# Altium schematic symbol library altera.SCHLIB: 68 symbols (part 4 of 6) (continued)
## EPF10K200-BGA672 (continued)
part 178 pins: L17 VCC (power)
part 179 pins: M2 VCC (power)
part 180 pins: M25 VCC (power)
part 181 pins: N11 VCC (power)
part 182 pins: N12 VCC (power)
part 183 pins: N15 VCC (power)
part 184 pins: P12 VCC (power)
part 185 pins: P15 VCC (power)
part 186 pins: P16 VCC (power)
part 187 pins: R14 VCC (power)
part 188 pins: T2 VCC (power)
part 189 pins: T10 VCC (power)
part 190 pins: T12 VCC (power)
part 191 pins: T17 VCC (power)
part 192 pins: T25 VCC (power)
part 193 pins: U16 VCC (power)
part 194 pins: Y7 VCC (power)
part 195 pins: AA26 VCCIO (power)
part 196 pins: AD15 VCCIO (power)
part 197 pins: C8 VCCIO (power)
part 198 pins: C15 VCCIO (power)
part 199 pins: D7 VCCIO (power)
part 200 pins: G3 VCCIO (power)
part 201 pins: J3 VCCIO (power)
part 202 pins: J17 VCCIO (power)
part 203 pins: K11 VCCIO (power)
part 204 pins: K22 VCCIO (power)
part 205 pins: L13 VCCIO (power)
part 206 pins: L15 VCCIO (power)
part 207 pins: M11 VCCIO (power)
part 208 pins: M13 VCCIO (power)
part 209 pins: M16 VCCIO (power)
part 210 pins: M22 VCCIO (power)
part 211 pins: N16 VCCIO (power)
part 212 pins: P11 VCCIO (power)
part 213 pins: R5 VCCIO (power)
part 214 pins: R11 VCCIO (power)
part 215 pins: R13 VCCIO (power)
part 216 pins: R16 VCCIO (power)
part 217 pins: R22 VCCIO (power)
part 218 pins: T15 VCCIO (power)
part 219 pins: U3 VCCIO (power)
part 220 pins: U11 VCCIO (power)
part 221 pins: V5 VCCIO (power)
part 222 pins: V17 VCCIO (power)
part 223 pins: V24 VCCIO (power)
part 224 pins: Y2 VCCIO (power)
part 225 pins: Y24 VCCIO (power)

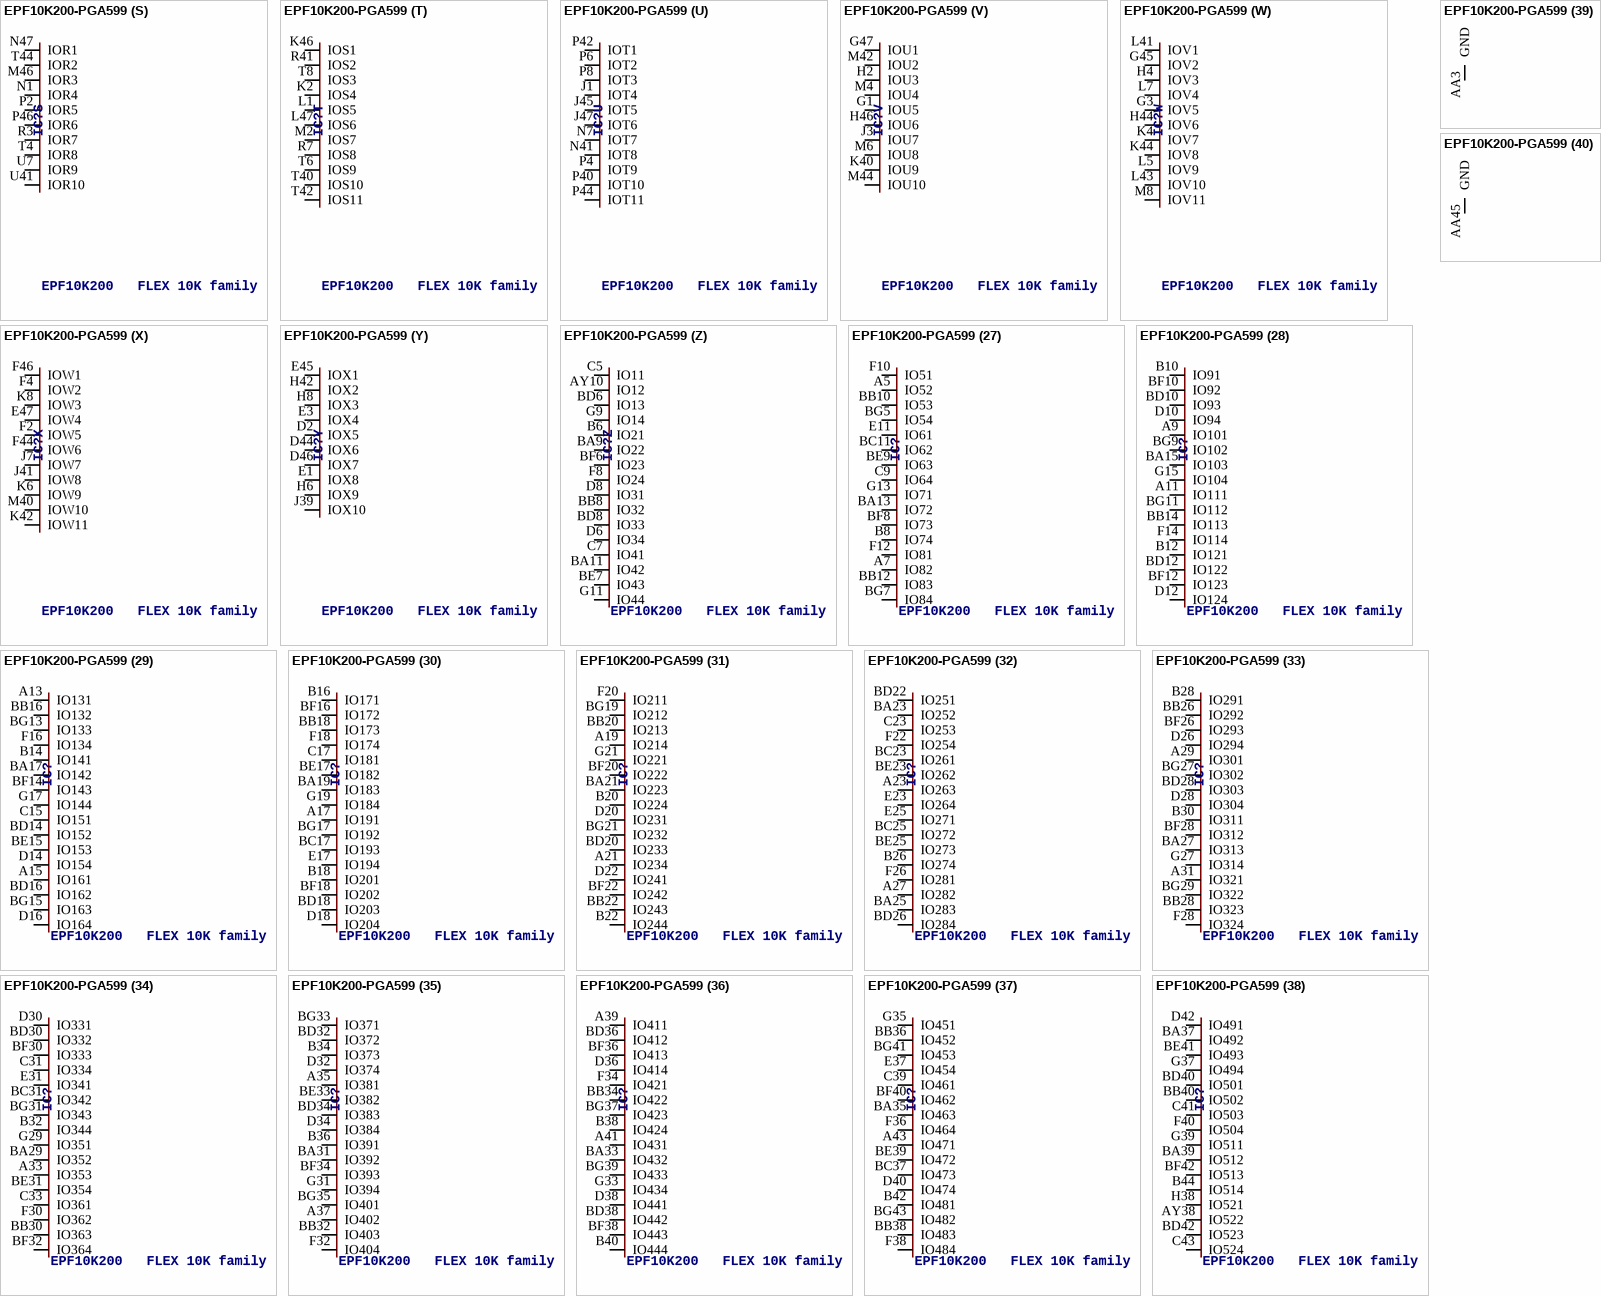
[diagram p33: symbol EPF10K200-PGA599]

## EPF10K200-PGA599
designator IC?, comment EPF10K200   FLEX 10K family
OC_FARNELL: unknown; OC_NEWARK: unknown
footprint PGA599
part A pins: A25 GCLK1, B4 /CONFIG, B24 IN1, B46 TRST, BB6 /CE, BB42 TDO, BC5 DATA0, BC43 CONF_DONE, BE5 DCLK, BE43 TCK, BF4 TDI, BF24 GCLK, BF44 /CEO, BG23 IN2, BG25 IN3, C3 MSEL1, C25 IN0, E43 /STATUS, F6 MSEL0, F42 TMS, W3 VCC_CKLK
part B pins: AW9 IOA4, AW39 IOA1, AY4 IOA5, AY6 IOA6, AY42 IOA3, AY44 IOA7, BC3 IOA8, BC45 IOA9, BD4 IOA10, BF2 IOA11, BF46 IOA2
part C pins: AV6 IOB5, AV8 IOB3, AV40 IOB6, AV42 IOB7, AW7 IOB8, AW41 IOB2, BB4 IOB4, BB44 IOB1, BB46 IOB9, BD2 IOB10, BD46 IOB11
part D pins: AT8 IOC3, AT40 IOC2, AU7 IOC5, AU41 IOC6, AV4 IOC4, AV44 IOC1, BA3 IOC7, BA45 IOC8, BB2 IOC9, BC47 IOC10
part E pins: AT4 IOD3, AT6 IOD5, AT42 IOD6, AT44 IOD2, AU5 IOD7, AU43 IOD8, AW3 IOD9, AW45 IOD1, AY2 IOD4, AY46 IOD10, BC1 IOD11
part F pins: AP4 IOE3, AP6 IOE4, AP8 IOE5, AP40 IOE6, AP42 IOE1, AP44 IOE7, AR7 IOE8, AR41 IOE9, AW47 IOE10, BA1 IOE2, BA47 IOE11
part G pins: AM8 IOF3, AM40 IOF4, AN7 IOF5, AN41 IOF1, AT46 IOF6, AU1 IOF7, AU47 IOF2, AV2 IOF8, AV46 IOF9, AW1 IOF10
part H pins: AL7 IOG3, AL41 IOG4, AM4 IOG2, AM6 IOG5, AM42 IOG6, AM44 IOG1, AP2 IOG7, AP46 IOG8, AR1 IOG9, AR47 IOG10, AT2 IOG11
part I pins: AK4 IOH4, AK6 IOH1, AK8 IOH2, AK40 IOH5, AK42 IOH6, AK44 IOH7, AL5 IOH3, AL43 IOH8, AN3 IOH9, AN45 IOH10, AN47 IOH11
part J pins: AH8 IOI3, AH40 IOI4, AJ7 IOI5, AJ41 IOI2, AL3 IOI6, AL45 IOI7, AL47 IOI8, AM2 IOI9, AM46 IOI10, AN1 IOI11
part K pins: AG7 IOJ5, AG41 IOJ6, AH4 IOJ3, AH6 IOJ7, AH42 IOJ1, AH44 IOJ8, AJ1 IOJ9, AJ47 IOJ10, AK2 IOJ4, AK46 IOJ11, AL1 IOJ12
part L pins: AF4 IOK3, AF6 IOK5, AF8 IOK6, AF40 IOK7, AF42 IOK2, AF44 IOK8, AF46 IOK9, AG1 IOK4, AG47 IOK1, AH2 IOK10, AH46 IOK11
part M pins: AD46 IOL4, AE1 IOL3, AE3 IOL5, AE5 IOL6, AE7 IOL7, AE41 IOL8, AE43 IOL2, AE45 IOL9, AE47 IOL1, AF2 IOL10
part N pins: AC1 IOM4, AC3 IOM3, AC5 IOM5, AC7 IOM6, AC41 IOM7, AC43 IOM2, AC45 IOM1, AC47 IOM8, AD2 IOM9, AD8 IOM10, AD40 IOM11
part O pins: AA1 ION5, AA47 ION6, AB2 ION4, AB4 ION7, AB6 ION8, AB8 ION3, AB40 ION2, AB42 ION9, AB44 ION1, AB46 ION10, Y46 ION11
part P pins: AA7 IOO4, AA41 IOO1, U47 IOO5, V2 IOO6, V46 IOO7, W1 IOO3, W47 IOO8, Y2 IOO9, Y4 IOO2, Y44 IOO10
part Q pins: T2 IOP4, T46 IOP5, U1 IOP6, U3 IOP2, U45 IOP1, W7 IOP7, W41 IOP8, Y6 IOP3, Y8 IOP9, Y40 IOP10, Y42 IOP11
part R pins: R1 IOQ2, R45 IOQ4, R47 IOQ5, U5 IOQ6, U43 IOQ7, V4 IOQ8, V6 IOQ3, V8 IOQ9, V40 IOQ10, V42 IOQ1, V44 IOQ11
part S pins: M46 IOR3, N1 IOR4, N47 IOR1, P2 IOR5, P46 IOR6, R3 IOR7, T4 IOR8, T44 IOR2, U7 IOR9, U41 IOR10
part T pins: K2 IOS4, K46 IOS1, L1 IOS5, L47 IOS6, M2 IOS7, R7 IOS8, R41 IOS2, T6 IOS9, T8 IOS3, T40 IOS10, T42 IOS11
part U pins: J1 IOT4, J45 IOT5, J47 IOT6, N7 IOT7, N41 IOT8, P4 IOT9, P6 IOT2, P8 IOT3, P40 IOT10, P42 IOT1, P44 IOT11
part V pins: G1 IOU5, G47 IOU1, H2 IOU3, H46 IOU6, J3 IOU7, K40 IOU9, M4 IOU4, M6 IOU8, M42 IOU2, M44 IOU10
part W pins: G3 IOV5, G45 IOV2, H4 IOV3, H44 IOV6, K4 IOV7, K44 IOV8, L5 IOV9, L7 IOV4, L41 IOV1, L43 IOV10, M8 IOV11
part X pins: E47 IOW4, F2 IOW5, F4 IOW2, F44 IOW6, F46 IOW1, J7 IOW7, J41 IOW8, K6 IOW9, K8 IOW3, K42 IOW11, M40 IOW10
part Y pins: D2 IOX5, D44 IOX6, D46 IOX7, E1 IOX8, E3 IOX4, E45 IOX1, H6 IOX9, H8 IOX3, H42 IOX2, J39 IOX10
part Z pins: AY10 IO12, B6 IO21, BA9 IO22, BA11 IO42, BB8 IO32, BD6 IO13, BD8 IO33, BE7 IO43, BF6 IO23, C5 IO11, C7 IO41, D6 IO34, D8 IO31, F8 IO24, G9 IO14, G11 IO44
part 27 pins: A5 IO52, A7 IO82, B8 IO74, BA13 IO72, BB10 IO53, BB12 IO83, BC11 IO62, BE9 IO63, BF8 IO73, BG5 IO54, BG7 IO84, C9 IO64, E11 IO61, F10 IO51, F12 IO81, G13 IO71
part 28 pins: A9 IO101, A11 IO111, B10 IO91, B12 IO121, BA15 IO103, BB14 IO113, BD10 IO93, BD12 IO122, BF10 IO92, BF12 IO123, BG9 IO102, BG11 IO112, D10 IO94, D12 IO124, F14 IO114, G15 IO104
part 29 pins: A13 IO131, A15 IO161, B14 IO141, BA17 IO142, BB16 IO132, BD14 IO152, BD16 IO162, BE15 IO153, BF14 IO143, BG13 IO133, BG15 IO163, C15 IO151, D14 IO154, D16 IO164, F16 IO134, G17 IO144
part 30 pins: A17 IO191, B16 IO171, B18 IO201, BA19 IO183, BB18 IO173, BC17 IO193, BD18 IO203, BE17 IO182, BF16 IO172, BF18 IO202, BG17 IO192, C17 IO181, D18 IO204, E17 IO194, F18 IO174, G19 IO184
part 31 pins: A19 IO214, A21 IO234, B20 IO224, B22 IO244, BA21 IO223, BB20 IO213, BB22 IO243, BD20 IO233, BF20 IO222, BF22 IO242, BG19 IO212, BG21 IO232, D20 IO231, D22 IO241, F20 IO211, G21 IO221
part 32 pins: A23 IO263, A27 IO282, B26 IO274, BA23 IO252, BA25 IO283, BC23 IO261, BC25 IO272, BD22 IO251, BD26 IO284, BE23 IO262, BE25 IO273, C23 IO253, E23 IO264, E25 IO271, F22 IO254, F26 IO281
part 33 pins: A29 IO301, A31 IO321, B28 IO291, B30 IO311, BA27 IO313, BB26 IO292, BB28 IO323, BD28 IO303, BF26 IO293, BF28 IO312, BG27 IO302, BG29 IO322, D26 IO294, D28 IO304, F28 IO324, G27 IO314
part 34 pins: A33 IO353, B32 IO344, BA29 IO352, BB30 IO363, BC31 IO342, BD30 IO332, BE31 IO354, BF30 IO333, BF32 IO364, BG31 IO343, C31 IO334, C33 IO361, D30 IO331, E31 IO341, F30 IO362, G29 IO351
part 35 pins: A35 IO381, A37 IO402, B34 IO373, B36 IO391, BA31 IO392, BB32 IO403, BD32 IO372, BD34 IO383, BE33 IO382, BF34 IO393, BG33 IO371, BG35 IO401, D32 IO374, D34 IO384, F32 IO404, G31 IO394
part 36 pins: A39 IO411, A41 IO431, B38 IO424, B40 IO444, BA33 IO432, BB34 IO422, BD36 IO412, BD38 IO442, BF36 IO413, BF38 IO443, BG37 IO423, BG39 IO433, D36 IO414, D38 IO441, F34 IO421, G33 IO434
part 37 pins: A43 IO471, B42 IO481, BA35 IO463, BB36 IO452, BB38 IO483, BC37 IO473, BE39 IO472, BF40 IO462, BG41 IO453, BG43 IO482, C39 IO461, D40 IO474, E37 IO454, F36 IO464, F38 IO484, G35 IO451
part 38 pins: AY38 IO522, B44 IO514, BA37 IO492, BA39 IO512, BB40 IO502, BD40 IO501, BD42 IO523, BE41 IO493, BF42 IO513, C41 IO503, C43 IO524, D42 IO491, F40 IO504, G37 IO494, G39 IO511, H38 IO521
part 39 pins: AA3 GND (power)
part 40 pins: AA45 GND (power)
part 41 pins: AD6 GND (power)
part 42 pins: AD42 GND (power)
part 43 pins: AG3 GND (power)
part 44 pins: AG45 GND (power)
part 45 pins: AJ5 GND (power)
part 46 pins: AJ43 GND (power)
part 47 pins: AR3 GND (power)
part 48 pins: AR5 GND (power)
part 49 pins: AR43 GND (power)
part 50 pins: AR45 GND (power)
part 51 pins: AY8 GND (power)
part 52 pins: AY40 GND (power)
part 53 pins: A47 GND (power)
part 54 pins: BA5 GND (power)
part 55 pins: BA43 GND (power)
part 56 pins: BB24 GND (power)
part 57 pins: BC7 GND (power)
part 58 pins: BC13 GND (power)
part 59 pins: BC19 GND (power)
part 60 pins: BC29 GND (power)
part 61 pins: BC35 GND (power)
part 62 pins: BC41 GND (power)
part 63 pins: BD44 GND (power)
part 64 pins: BE3 GND (power)
part 65 pins: BE13 GND (power)
part 66 pins: BE21 GND (power)
part 67 pins: BE27 GND (power)
part 68 pins: BE35 GND (power)
part 69 pins: BE45 GND (power)
part 70 pins: BG1 GND (power)
part 71 pins: BG47 GND (power)
part 72 pins: B2 GND (power)
part 73 pins: C13 GND (power)
part 74 pins: C21 GND (power)
part 75 pins: C27 GND (power)
part 76 pins: C35 GND (power)
part 77 pins: C45 GND (power)
part 78 pins: D4 GND (power)
part 79 pins: E7 GND (power)
part 80 pins: E13 GND (power)
part 81 pins: E19 GND (power)
part 82 pins: E29 GND (power)
part 83 pins: E35 GND (power)
part 84 pins: E41 GND (power)
part 85 pins: F24 GND (power)
part 86 pins: G5 GND (power)
part 87 pins: G23 GND (power)
part 88 pins: G43 GND (power)
part 89 pins: H40 GND (power)
part 90 pins: N3 GND (power)
part 91 pins: N5 GND (power)
part 92 pins: N43 GND (power)
part 93 pins: N45 GND (power)
part 94 pins: W5 GND (power)
part 95 pins: W43 GND (power)
part 96 pins: AJ3 VCC (power)
part 97 pins: AJ45 VCC (power)
part 98 pins: AU3 VCC (power)
part 99 pins: AU45 VCC (power)
part 100 pins: A3 VCC (power)
part 101 pins: A45 VCC (power)
part 102 pins: BE1 VCC (power)
part 103 pins: BE11 VCC (power)
part 104 pins: BE19 VCC (power)
part 105 pins: BE29 VCC (power)
part 106 pins: BE37 VCC (power)
part 107 pins: BE47 VCC (power)
part 108 pins: BG3 VCC (power)
part 109 pins: BG45 VCC (power)
part 110 pins: C1 VCC (power)
part 111 pins: C11 VCC (power)
part 112 pins: C19 VCC (power)
part 113 pins: C29 VCC (power)
part 114 pins: C37 VCC (power)
part 115 pins: C47 VCC (power)
part 116 pins: E5 VCC (power)
part 117 pins: G25 VCC (power)
part 118 pins: L3 VCC (power)
part 119 pins: L45 VCC (power)
part 120 pins: W45 VCC (power)
part 121 pins: AA5 VCCIO (power)
part 122 pins: AA43 VCCIO (power)
part 123 pins: AD4 VCCIO (power)
part 124 pins: AD44 VCCIO (power)
part 125 pins: AG5 VCCIO (power)
part 126 pins: AG43 VCCIO (power)
part 127 pins: AN5 VCCIO (power)
part 128 pins: AN43 VCCIO (power)
part 129 pins: AW5 VCCIO (power)
part 130 pins: AW43 VCCIO (power)
part 131 pins: BA7 VCCIO (power)
part 132 pins: BA41 VCCIO (power)
part 133 pins: BC9 VCCIO (power)
part 134 pins: BC15 VCCIO (power)
part 135 pins: BC21 VCCIO (power)
part 136 pins: BC27 VCCIO (power)
part 137 pins: BC33 VCCIO (power)
part 138 pins: BC39 VCCIO (power)
part 139 pins: BD24 VCCIO (power)
part 140 pins: D24 VCCIO (power)
part 141 pins: E9 VCCIO (power)
part 142 pins: E15 VCCIO (power)
part 143 pins: E21 VCCIO (power)
part 144 pins: E27 VCCIO (power)
part 145 pins: E33 VCCIO (power)
part 146 pins: E39 VCCIO (power)
part 147 pins: G7 VCCIO (power)
part 148 pins: G41 VCCIO (power)
part 149 pins: J5 VCCIO (power)
part 150 pins: J43 VCCIO (power)
part 151 pins: R5 VCCIO (power)
part 152 pins: R43 VCCIO (power)

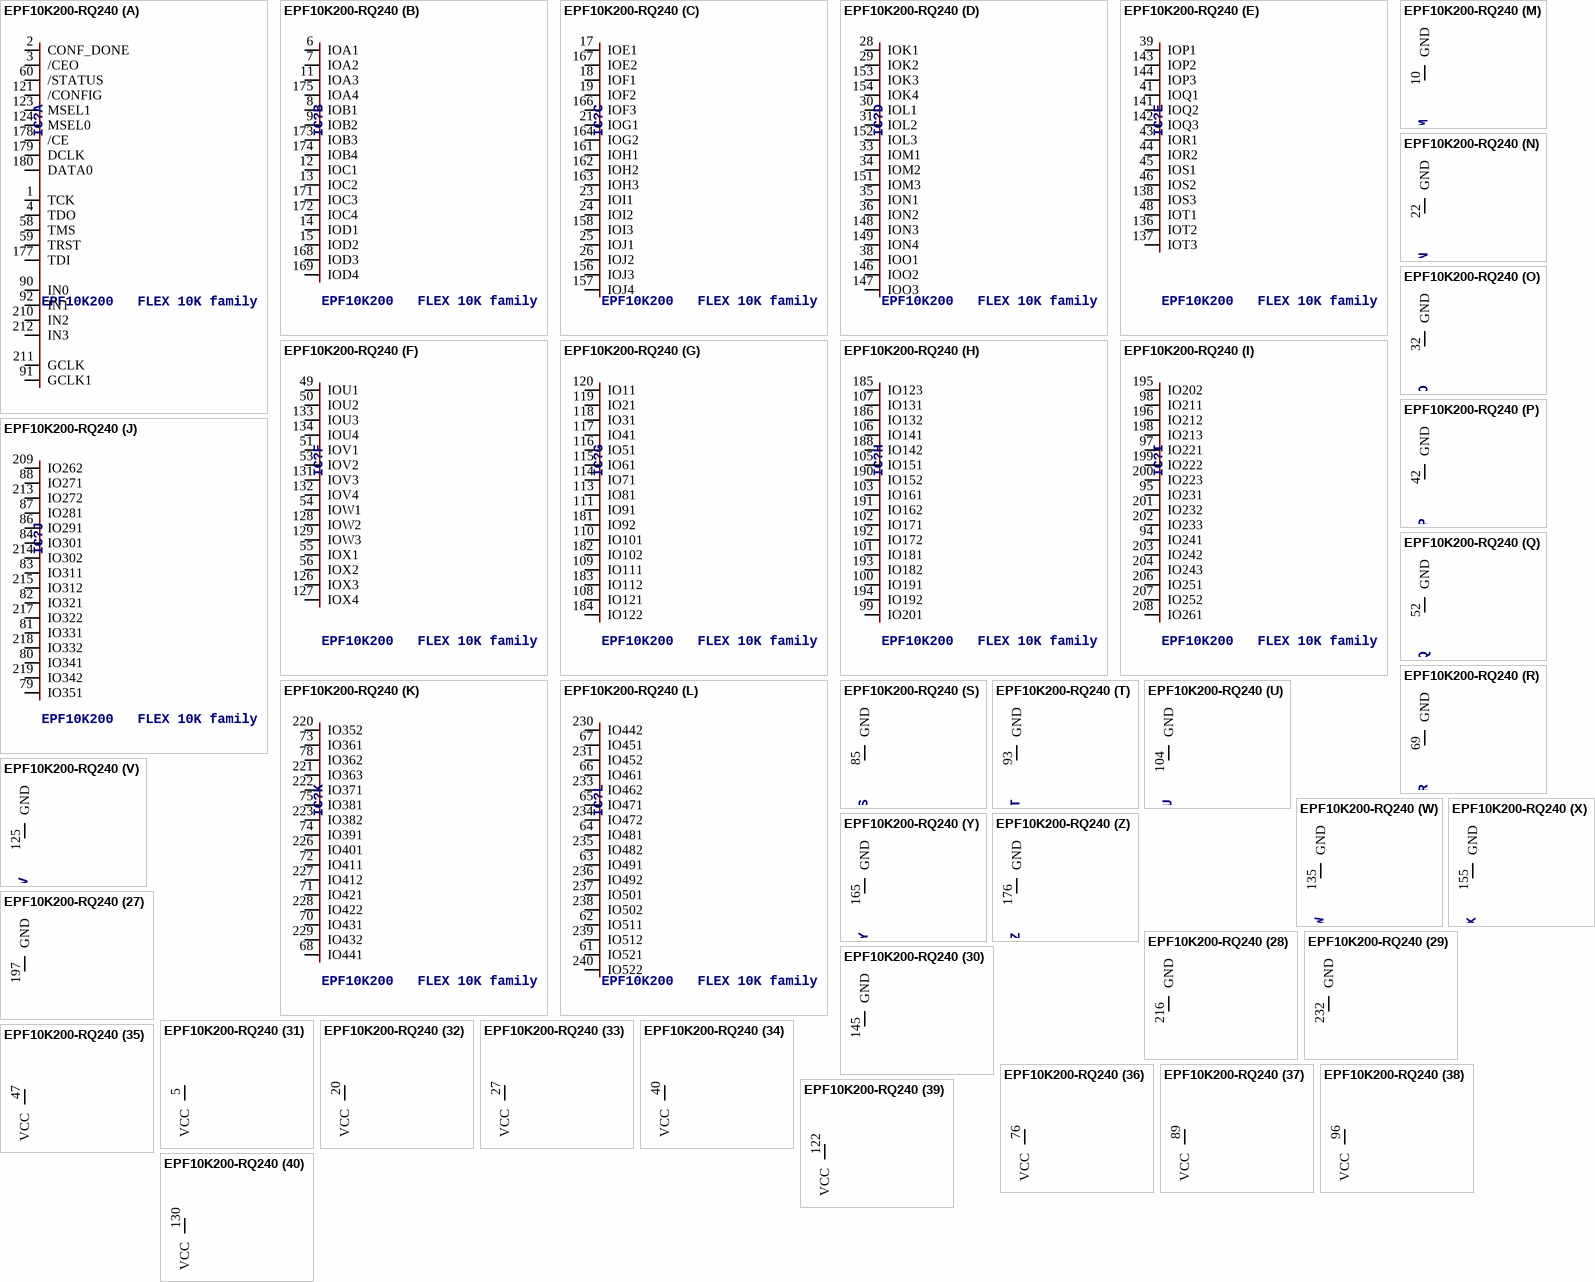
[diagram p34: symbol EPF10K200-RQ240]

## EPF10K200-RQ240
designator IC?, comment EPF10K200   FLEX 10K family
MPN: EPF10K200SRC240-3N; OC_FARNELL: unknown; OC_NEWARK: 51R8934
footprint RQFP240
part A pins: 1 TCK, 2 CONF_DONE, 3 /CEO, 4 TDO, 58 TMS, 59 TRST, 60 /STATUS, 90 IN0, 91 GCLK1, 92 IN1, 121 /CONFIG, 123 MSEL1, 124 MSEL0, 177 TDI, 178 /CE, 179 DCLK, 180 DATA0, 210 IN2, 211 GCLK, 212 IN3
part B pins: 6 IOA1, 7 IOA2, 8 IOB1, 9 IOB2, 11 IOA3, 12 IOC1, 13 IOC2, 14 IOD1, 15 IOD2, 168 IOD3, 169 IOD4, 171 IOC3, 172 IOC4, 173 IOB3, 174 IOB4, 175 IOA4
part C pins: 17 IOE1, 18 IOF1, 19 IOF2, 21 IOG1, 23 IOI1, 24 IOI2, 25 IOJ1, 26 IOJ2, 156 IOJ3, 157 IOJ4, 158 IOI3, 161 IOH1, 162 IOH2, 163 IOH3, 164 IOG2, 166 IOF3, 167 IOE2
part D pins: 28 IOK1, 29 IOK2, 30 IOL1, 31 IOL2, 33 IOM1, 34 IOM2, 35 ION1, 36 ION2, 38 IOO1, 146 IOO2, 147 IOO3, 148 ION3, 149 ION4, 151 IOM3, 152 IOL3, 153 IOK3, 154 IOK4
part E pins: 39 IOP1, 41 IOQ1, 43 IOR1, 44 IOR2, 45 IOS1, 46 IOS2, 48 IOT1, 136 IOT2, 137 IOT3, 138 IOS3, 141 IOQ2, 142 IOQ3, 143 IOP2, 144 IOP3
part F pins: 49 IOU1, 50 IOU2, 51 IOV1, 53 IOV2, 54 IOW1, 55 IOX1, 56 IOX2, 126 IOX3, 127 IOX4, 128 IOW2, 129 IOW3, 131 IOV3, 132 IOV4, 133 IOU3, 134 IOU4
part G pins: 108 IO121, 109 IO111, 110 IO101, 111 IO91, 113 IO81, 114 IO71, 115 IO61, 116 IO51, 117 IO41, 118 IO31, 119 IO21, 120 IO11, 181 IO92, 182 IO102, 183 IO112, 184 IO122
part H pins: 99 IO201, 100 IO191, 101 IO181, 102 IO171, 103 IO161, 105 IO151, 106 IO141, 107 IO131, 185 IO123, 186 IO132, 188 IO142, 190 IO152, 191 IO162, 192 IO172, 193 IO182, 194 IO192
part I pins: 94 IO241, 95 IO231, 97 IO221, 98 IO211, 195 IO202, 196 IO212, 198 IO213, 199 IO222, 200 IO223, 201 IO232, 202 IO233, 203 IO242, 204 IO243, 206 IO251, 207 IO252, 208 IO261
part J pins: 79 IO351, 80 IO341, 81 IO331, 82 IO321, 83 IO311, 84 IO301, 86 IO291, 87 IO281, 88 IO271, 209 IO262, 213 IO272, 214 IO302, 215 IO312, 217 IO322, 218 IO332, 219 IO342
part K pins: 68 IO441, 70 IO431, 71 IO421, 72 IO411, 73 IO361, 74 IO391, 75 IO381, 78 IO362, 220 IO352, 221 IO363, 222 IO371, 223 IO382, 226 IO401, 227 IO412, 228 IO422, 229 IO432
part L pins: 61 IO521, 62 IO511, 63 IO491, 64 IO481, 65 IO471, 66 IO461, 67 IO451, 230 IO442, 231 IO452, 233 IO462, 234 IO472, 235 IO482, 236 IO492, 237 IO501, 238 IO502, 239 IO512, 240 IO522
part M pins: 10 GND (power)
part N pins: 22 GND (power)
part O pins: 32 GND (power)
part P pins: 42 GND (power)
part Q pins: 52 GND (power)
part R pins: 69 GND (power)
part S pins: 85 GND (power)
part T pins: 93 GND (power)
part U pins: 104 GND (power)
part V pins: 125 GND (power)
part W pins: 135 GND (power)
part X pins: 155 GND (power)
part Y pins: 165 GND (power)
part Z pins: 176 GND (power)
part 27 pins: 197 GND (power)
part 28 pins: 216 GND (power)
part 29 pins: 232 GND (power)
part 30 pins: 145 GND (power)
part 31 pins: 5 VCC (power)
part 32 pins: 20 VCC (power)
part 33 pins: 27 VCC (power)
part 34 pins: 40 VCC (power)
part 35 pins: 47 VCC (power)
part 36 pins: 76 VCC (power)
part 37 pins: 89 VCC (power)
part 38 pins: 96 VCC (power)
part 39 pins: 122 VCC (power)
part 40 pins: 130 VCC (power)
part 41 pins: 139 VCC (power)
part 42 pins: 150 VCC (power)
part 43 pins: 159 VCC (power)
part 44 pins: 170 VCC (power)
part 45 pins: 187 VCC (power)
part 46 pins: 225 VCC (power)
part 47 pins: 16 VCCIO (power)
part 48 pins: 37 VCCIO (power)
part 49 pins: 57 VCCIO (power)
part 50 pins: 77 VCCIO (power)
part 51 pins: 112 VCCIO (power)
part 52 pins: 140 VCCIO (power)
part 53 pins: 160 VCCIO (power)
part 54 pins: 189 VCCIO (power)
part 55 pins: 205 VCCIO (power)
part 56 pins: 224 VCCIO (power)

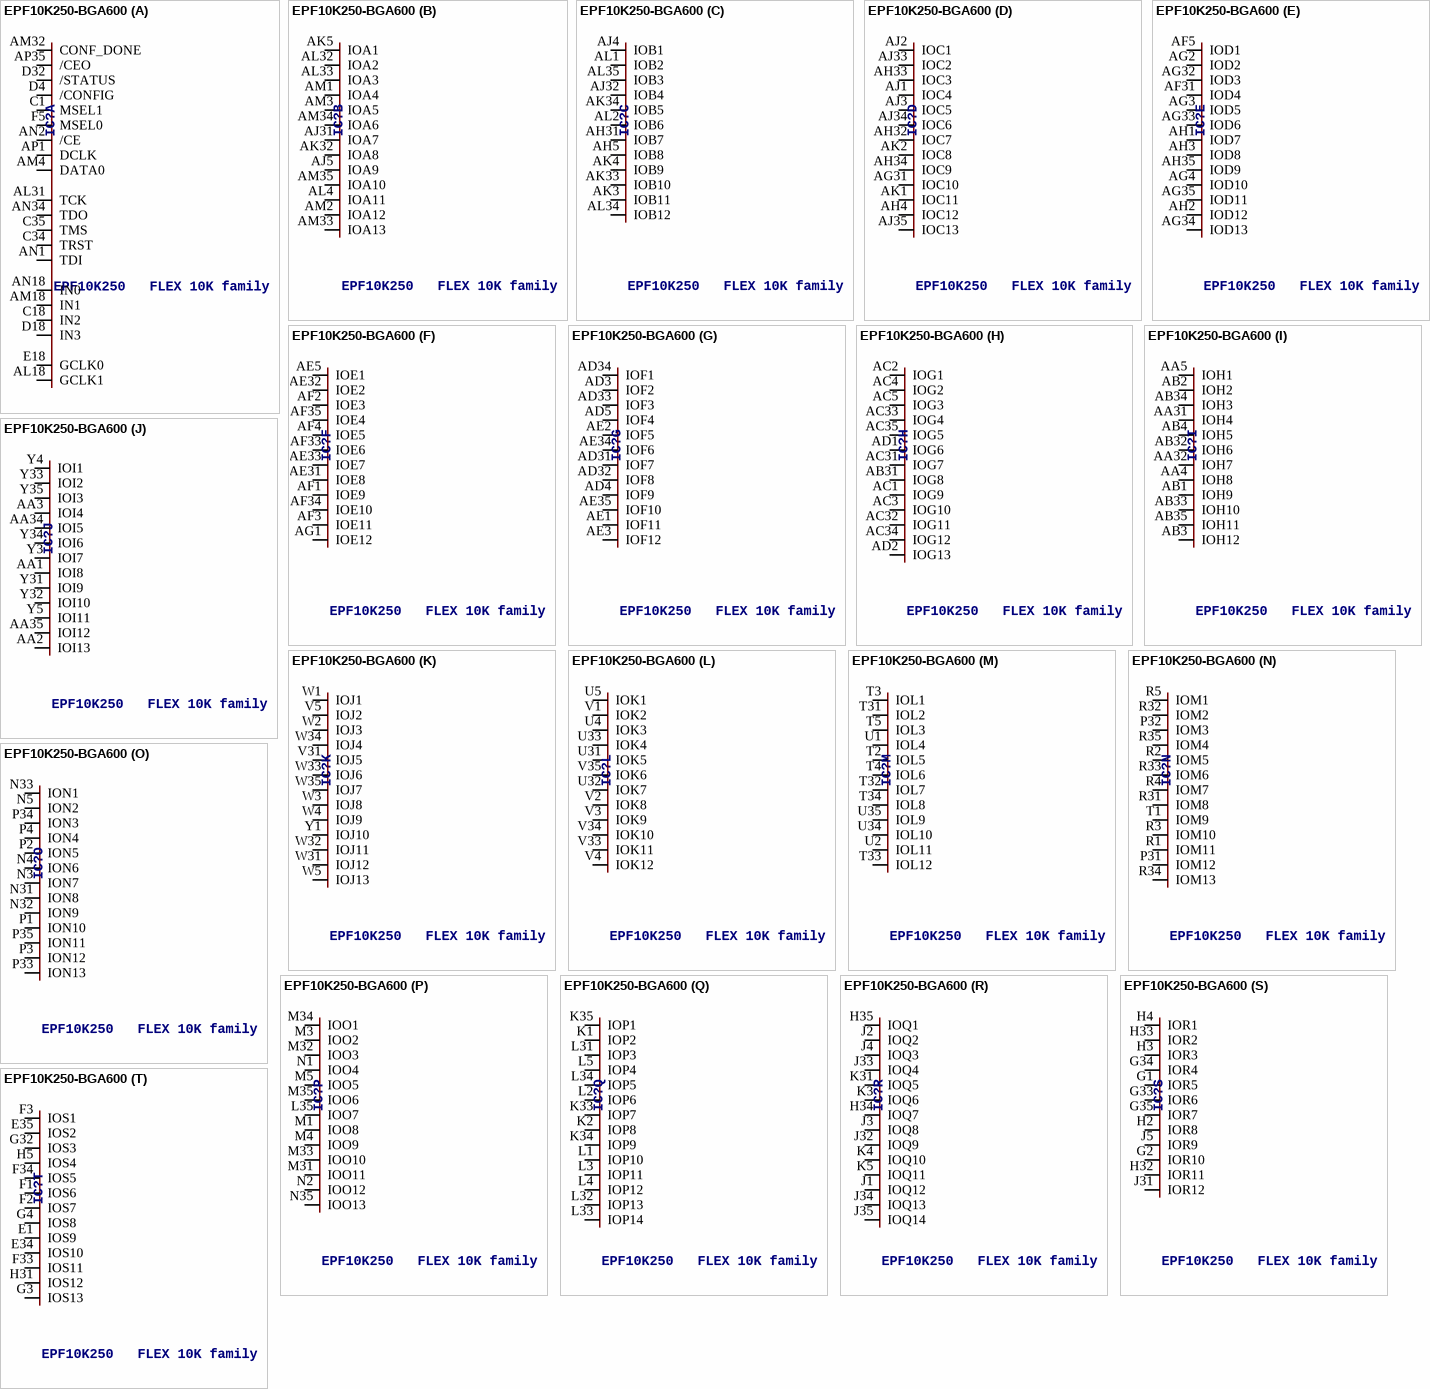
[diagram p35: symbol EPF10K250-BGA600]

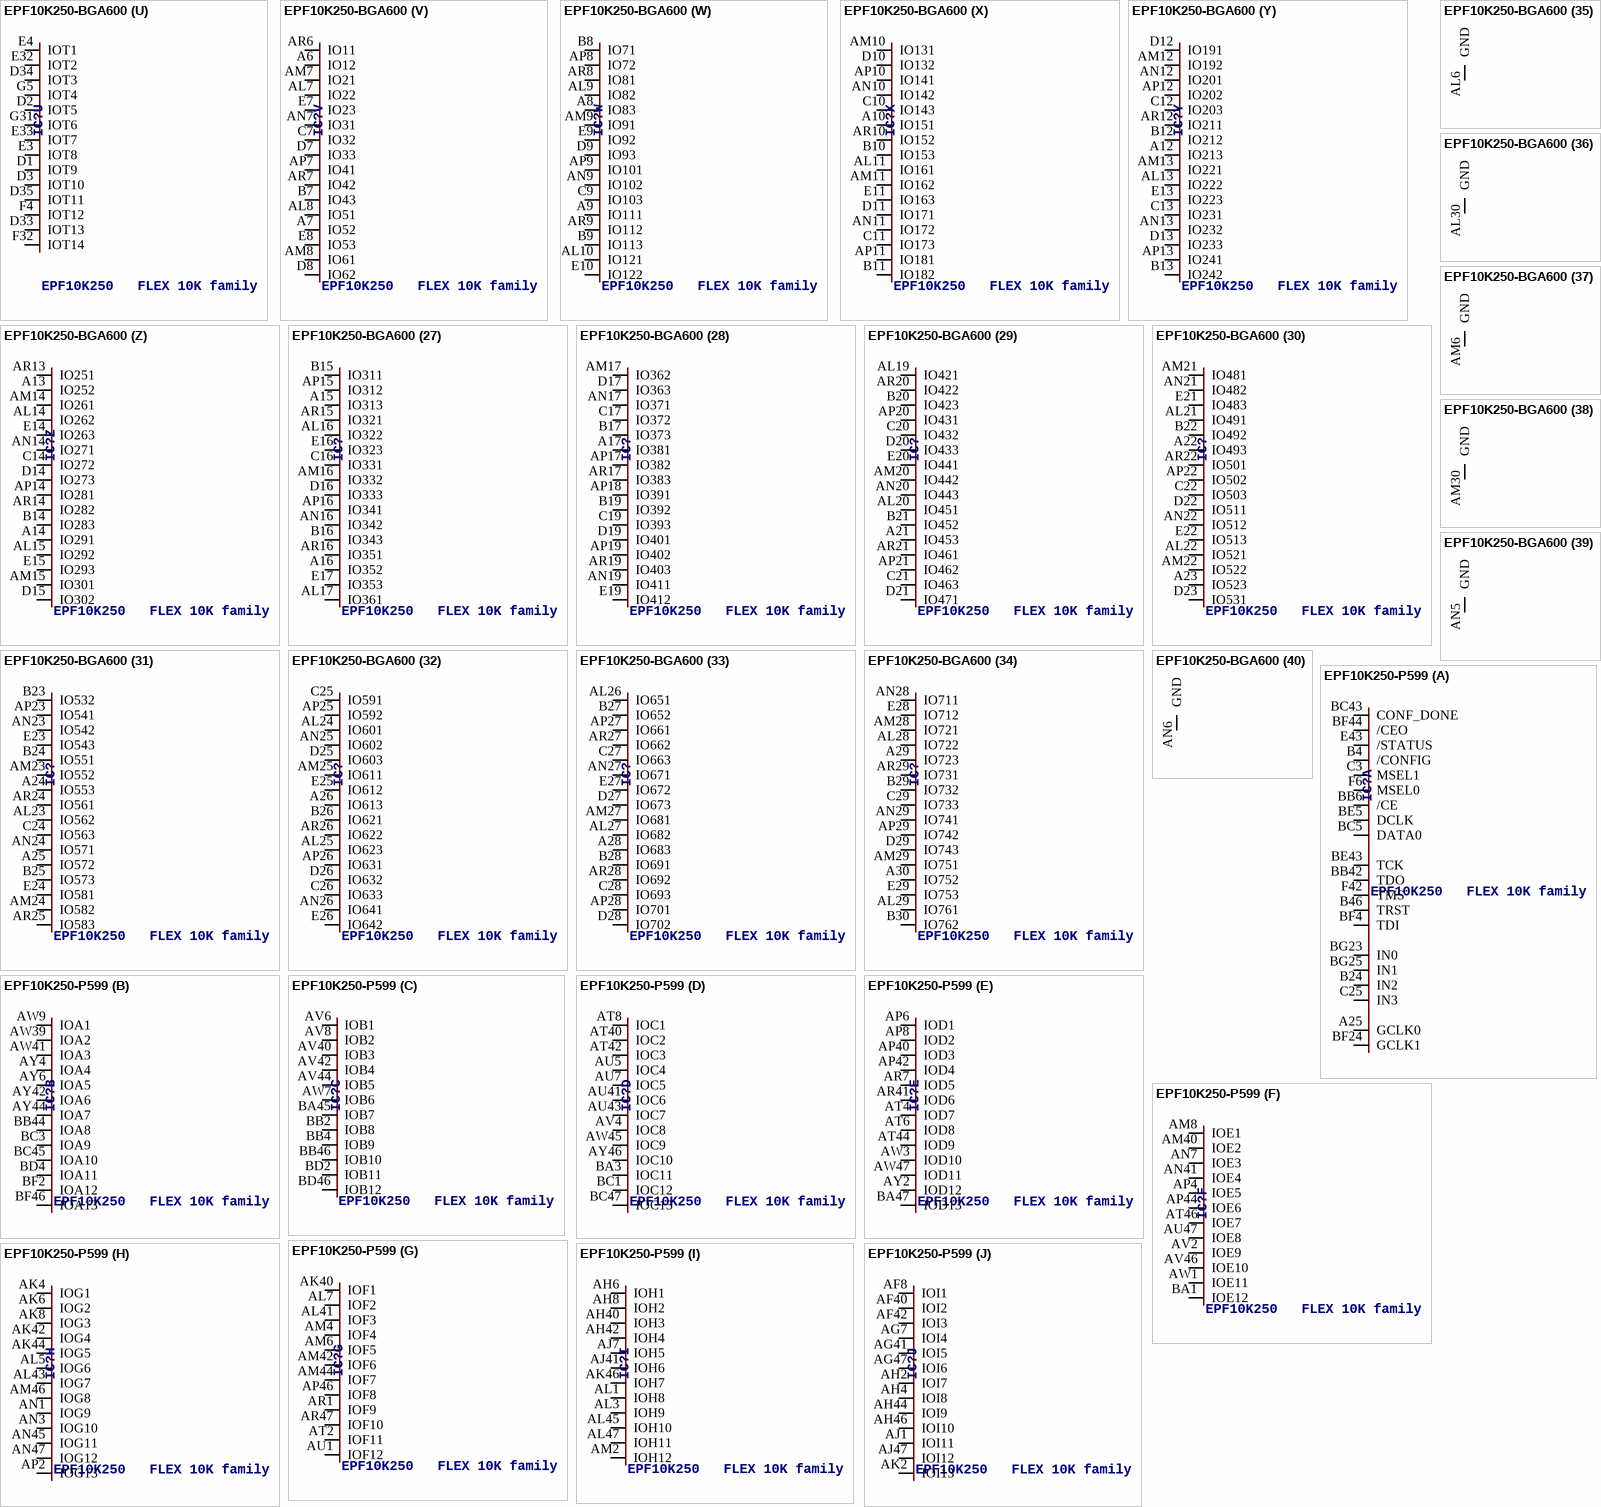
[diagram p36: symbols EPF10K250-BGA600 to EPF10K250-P599]